# Altium footprint library TP_FINAL_LIB.PcbLib: 16 footprints
Each footprint in its own frame and in the unit in brackets; x right, y up, seen from the top. Pads: shape width x height; smd on the part's side, far side on the other; paste and mask are expansions set on the pad; w line width, h text height; cw(c..) or ccw(c..) is an arc to the next point about the centre after c.
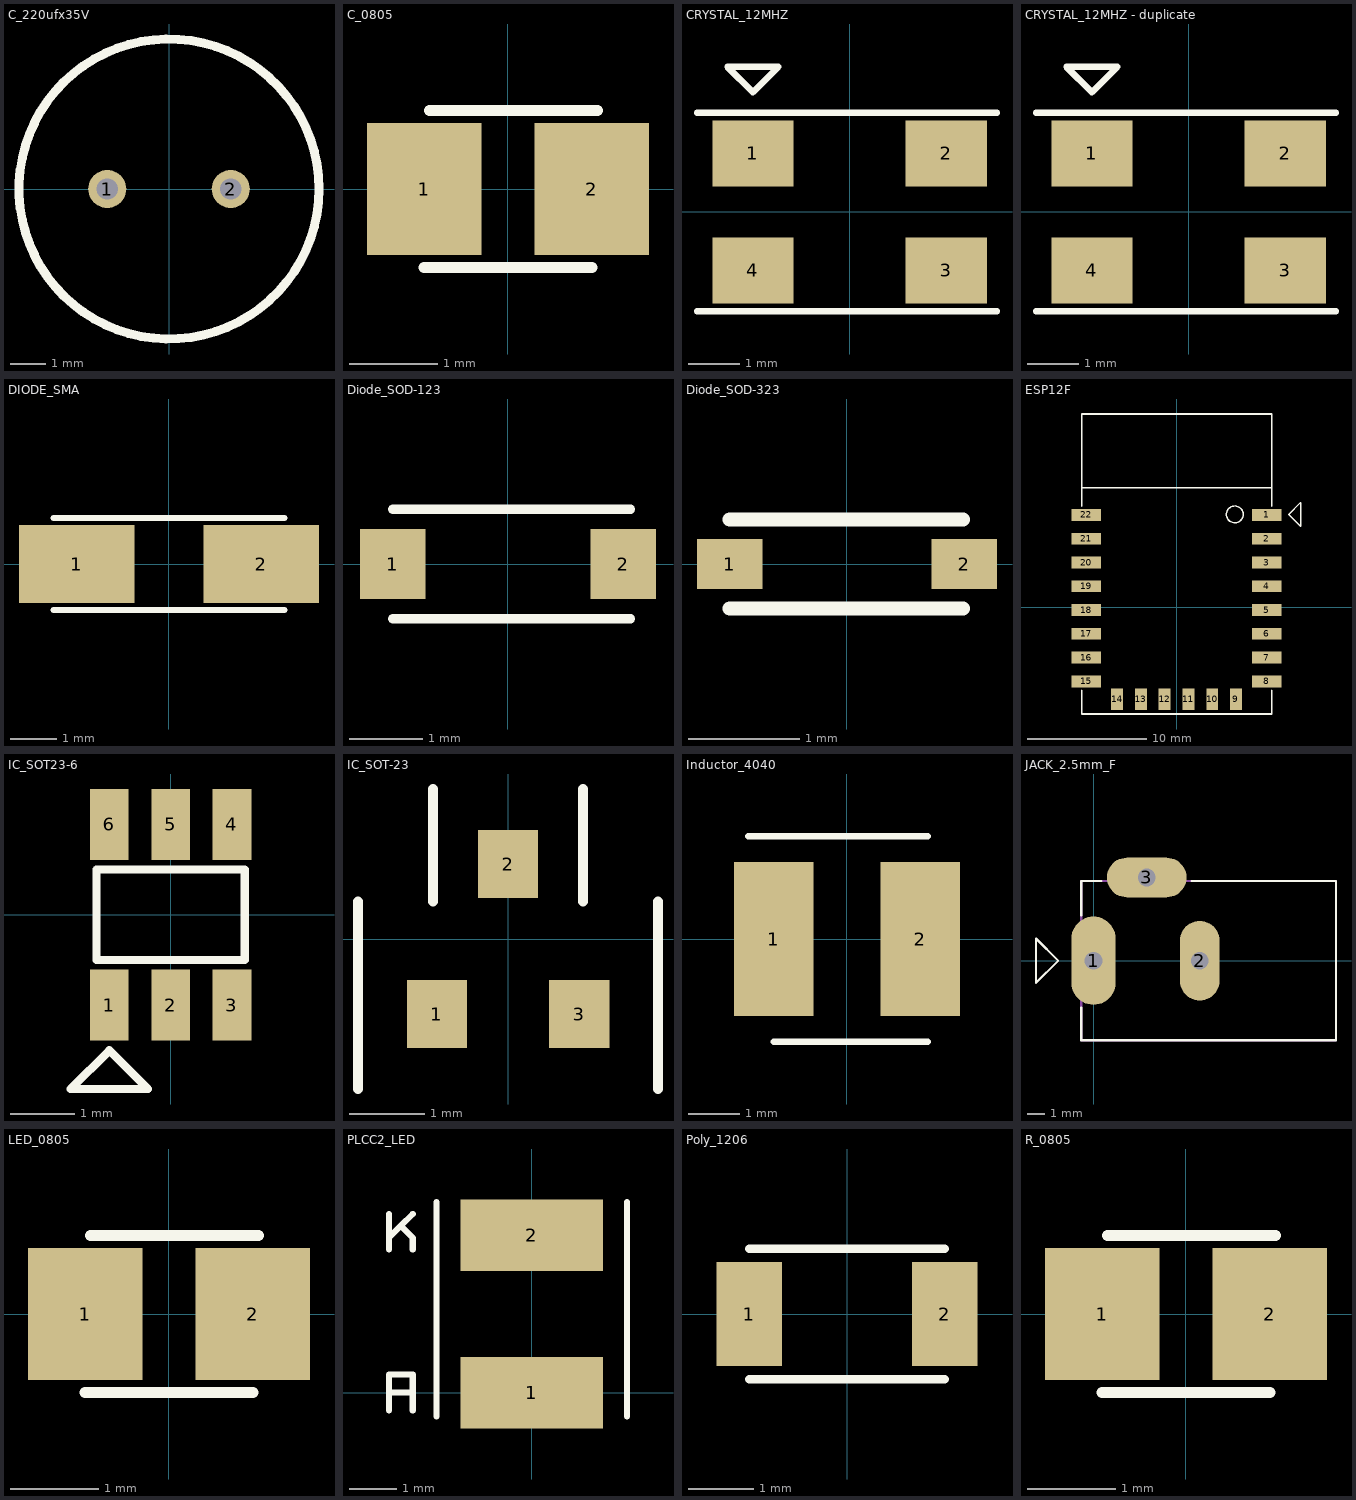
[diagram p0: the footprints below, top view; thin cyan lines are the x and y axes]

## C_220ufx35V [mm]
pads (2):
  round 1.08 hole 0.6: 1(-1.75,0) 2(1.75,0)
Top Overlay:
  circle w0.254: c0,0 r4.25
3D body "Capacitor_Electrolico.stp": height 18, standoff -10, extent -4.25,-4.25 4.25,4.25

## C_0805 [mm]
pads (2):
  rect 1.3x1.5 smd: 1(-0.95,0) 2(0.95,0)
Top Overlay:
  lines w0.127: -0.953,-0.889 -0.476,-0.889 0.476,-0.889 0.953,-0.889 ; -0.889,0.889 1.016,0.889
3D body "SMD Capacitor 0805.STEP": height 0.8, standoff 0, extent -1,-0.625 1,0.625

## CRYSTAL_12MHZ [mm]
pads (4):
  rect 1.6x1.3 smd: 1(-1.9,1.15) 2(1.9,1.15) 3(1.9,-1.15) 4(-1.9,-1.15)
Top Overlay:
  lines w0.127: -3,-1.95 2.9,-1.95 ; -3,1.95 2.9,1.95 ; -2.4,2.85 -1.4,2.85 -1.9,2.35 -2.4,2.85
3D body "ABM3C-12.000MHZ-D4Y-T.stp": height 1.1, standoff 0, extent -2.57,-1.64 2.57,1.7

## CRYSTAL_12MHZ - duplicate [mm]
pads (4):
  rect 1.6x1.3 smd: 1(-1.9,1.15) 2(1.9,1.15) 3(1.9,-1.15) 4(-1.9,-1.15)
Top Overlay:
  lines w0.127: -3,-1.95 2.9,-1.95 ; -3,1.95 2.9,1.95 ; -2.4,2.85 -1.9,2.35 -1.4,2.85 -2.4,2.85
3D body "ABM3C-12.000MHZ-D4Y-T.stp": height 1.1, standoff 0, extent -2.57,-1.64 2.57,1.7

## DIODE_SMA [mm]
pads (2):
  rect 2.5x1.7 smd: 1(-2,0) 2(2,0)
Top Overlay:
  lines w0.127: -2.5,-1 2.5,-1 ; -2.5,1 2.5,1
3D body "Diode SMA.stp": height 2.41, standoff 0, extent -2.66,-1.41 2.62,1.51

## Diode_SOD-123 [mm]
pads (2):
  rect 0.9x0.95 smd: 1(-1.575,0) 2(1.575,0)
Top Overlay:
  lines w0.127: -1.575,-0.75 1.675,-0.75 ; -1.575,0.75 1.675,0.75
3D body "sod123 v4.step": height 1.2, standoff 0, extent -1.875,-0.86 1.875,0.84

## Diode_SOD-323 [mm]
pads (2):
  rect 0.59x0.45 smd: 1(-1.055,0) 2(1.055,0)
Top Overlay:
  lines w0.127: -1.055,-0.4 1.045,-0.4 ; -1.055,0.4 1.045,0.4
3D body "SOD-323.STEP": height 1.13, standoff -0.02, extent -1.35,-0.733 1.35,0.713

## ESP12F [mm]
pads (22):
  rect 2.5x1 smd: 1(7.6,7.75) 2(7.6,5.75) 3(7.6,3.75) 4(7.6,1.75) 5(7.6,-0.25) 6(7.6,-2.25) 7(7.6,-4.25) 8(7.6,-6.25) 15(-7.6,-6.25) 16(-7.6,-4.25) 17(-7.6,-2.25) 18(-7.6,-0.25) 19(-7.6,1.75) 20(-7.6,3.75) 21(-7.6,5.75) 22(-7.6,7.75)
  rect 1x1.8 smd: 9(5,-7.75) 10(3,-7.75) 11(1,-7.75) 12(-1,-7.75) 13(-3,-7.75) 14(-5,-7.75)
Top Overlay:
  circle w0.127: c4.9,7.8 r0.71
  lines w0.127: -8,-7 -8,-9 8,-9 8,-7 ; -8,8.5 -8,10.05 ; 8,8.5 8,10.05 ; -8,10.05 8,10.05 ; -8,10.05 -8,16.25 -5,16.25 8,16.25 8,10.05 ; 9.44,7.8 10.44,6.8 10.44,8.8 9.44,7.8
3D body "ESP-12F.STEP": height 3.13, standoff -0.04, extent -8,-7.75 8,16.25

## IC_SOT23-6 [mm]
pads (6):
  rect 0.6x1.1 smd: 1(-0.95,-1.4) 2(0,-1.4) 3(0.95,-1.4) 4(0.95,1.4) 5(0,1.4) 6(-0.95,1.4)
Top Overlay:
  lines w0.127: -1.55,-2.7 -0.95,-2.1 -0.35,-2.7 -0.95,-2.7 -1.55,-2.7 ; -1.15,-0.7 -1.15,0.7 1.15,0.7 1.15,-0.7 -1.15,-0.7
3D body "SOT-23-6.stp": height -0.4, standoff -1.4, extent -1.45,-1.18 1.45,1.22

## IC_SOT-23 [mm]
pads (3):
  rect 0.8x0.9 smd: 1(-0.95,-1) 2(0,1) 3(0.95,-1)
Top Overlay:
  lines w0.127: -2,-2 -2,0.5 ; -1,0.5 -1,1.5 -1,2 ; 1,0.5 1,2 ; 2,-2 2,0.5
3D body "SOT-23.STEP": height 0.96, standoff -0.04, extent -1.42,-1.39 1.48,1.21

## Inductor_4040 [mm]
pads (2):
  rect 1.55x3 smd: 1(-1.425,0) 2(1.425,0)
Top Overlay:
  lines w0.127: -1.925,2 1.575,2 ; -1.425,-2 1.575,-2
3D body "LQH44PH2R2MPRL.stp": height 1.9, standoff 0, extent -2.135,-1.98 1.955,2.02

## JACK_2.5mm_F [mm]
pads (3):
  oval 2.5x5 hole 1 square: 1(0,0)
  oval 2.25x4.5 hole 1 square: 2(6,0)
  oval 4.5x2.25 hole 1 square: 3(3,4.7)
Top Overlay:
  lines w0.127: -0.7,-2.65 -0.7,-4.5 13.7,-4.5 13.7,4.5 5.55,4.5 ; -0.7,2.55 -0.7,4.5 0.45,4.5 ; -3.25,-1.25 -2,0 -3.25,1.25 -3.25,-1.25
Mechanical 13:
  lines w0.127: -0.7,-4.5 -0.7,4.5 13.7,4.5 13.7,-4.5 -0.7,-4.5
3D body "CUI_DEVICES_PJ-002BH.sldprt": height 11, standoff -3.5, extent -0.7,-4.5 13.7,4.9

## LED_0805 [mm]
pads (2):
  rect 1.3x1.5 smd: 1(-0.95,0) 2(0.95,0)
Top Overlay:
  lines w0.127: -0.953,-0.889 -0.476,-0.889 0.476,-0.889 0.953,-0.889 ; -0.889,0.889 1.016,0.889
3D body "LED_0805.stp": height 1.1, standoff 0, extent -1.01,-0.635 0.99,0.615

## PLCC2_LED [mm]
pads (2):
  rect 3x1.5 smd: 1(0,0) 2(0,3.3)
Top Overlay:
  lines w0.127: -3,-0.375 -3,0.375 -2.5,0.375 -2.5,-0.375 -2.5,0 -3,0 ; -3,3 -3,3.75 ; -3,3.25 -2.5,3.75 -2.75,3.5 -2.5,3.25 -2.5,3 ; -2,-0.5 -2,4 ; 2,-0.5 2,4
3D body "PLCC-2.STEP": height 1.9, standoff 0, extent -1.4,0 1.4,3.5

## Poly_1206 [mm]
pads (2):
  rect 1x1.6 smd: 1(-1.5,0) 2(1.5,0)
Top Overlay:
  lines w0.127: -1.5,-1 1.5,-1 ; -1.5,1 1.5,1
3D body "POLY-1206.stp": height 0.68, standoff 0, extent -1.64,-0.822 1.56,0.762

## R_0805 [mm]
pads (2):
  rect 1.3x1.5 smd: 1(-0.95,0) 2(0.95,0)
Top Overlay:
  lines w0.127: -0.953,-0.889 -0.476,-0.889 0.476,-0.889 0.953,-0.889 ; -0.889,0.889 1.016,0.889
3D body "RESC-0805.stp": height 0.6, standoff 0, extent -1.02,-0.685 1.08,0.665